# Altium footprint library Modules.PcbLib: 6 footprints (part 5 of 6) (continued)
## ARDUINO MEGA M_Shield [mm] "ARDUINO MEGA 2560 Full Mother Shield" (continued)
3D body: height 8, standoff 7.5, extent -49.251,21.852 -47.219,22.352
3D body: height 8, standoff 7.5, extent -49.268,21.844 -48.768,23.876
3D body: height 8, standoff 7.5, extent -49.276,23.368 -47.244,23.869
3D body: height 8, standoff 7.5, extent -47.752,21.844 -47.252,23.876
3D body: height 7.5, standoff 0, extent -47.752,22.327 -47.727,23.394
3D body: height 7.5, standoff 0, extent -48.793,22.327 -48.768,23.394
3D body: height 7.5, standoff 0, extent -48.793,23.368 -47.727,23.394
3D body: height 7.5, standoff 0, extent -48.793,19.787 -47.727,19.812
3D body: height 8, standoff 0, extent -47.269,19.05 -46.99,21.59
3D body: height 8, standoff 0, extent -49.53,21.311 -46.99,21.59
3D body: height 0, standoff -2.03, extent -48.387,20.066 -48.133,20.574
3D body: height 8, standoff 0, extent -49.53,19.05 -46.99,19.33
3D body: height 7, standoff 0, extent -48.794,19.787 -47.727,19.838
3D body: height 7, standoff 0, extent -47.778,19.787 -47.727,20.854
3D body: height 7, standoff 0, extent -48.794,20.803 -47.727,20.854
3D body: height 7, standoff 0, extent -48.794,19.787 -48.743,20.854
3D body: height 1, standoff 0, extent -48.895,19.685 -47.625,20.955
3D body: height 8, standoff 0, extent -49.53,19.05 -49.251,21.59
3D body: height 8, standoff 7.5, extent -49.251,19.312 -47.219,19.812
3D body: height 8, standoff 7.5, extent -49.268,19.304 -48.768,21.336
3D body: height 8, standoff 7.5, extent -49.276,20.828 -47.244,21.329
3D body: height 8, standoff 7.5, extent -47.752,19.304 -47.252,21.336
3D body: height 7.5, standoff 0, extent -47.752,19.787 -47.727,20.854
3D body: height 7.5, standoff 0, extent -48.793,19.787 -48.768,20.854
3D body: height 7.5, standoff 0, extent -48.793,20.828 -47.727,20.854
3D body: height 7.5, standoff 0, extent -48.793,17.247 -47.727,17.272
3D body: height 8, standoff 0, extent -47.269,16.51 -46.99,19.05
3D body: height 8, standoff 0, extent -49.53,18.771 -46.99,19.05
3D body: height 0, standoff -2.03, extent -48.387,17.526 -48.133,18.034
3D body: height 8, standoff 0, extent -49.53,16.51 -46.99,16.79
3D body: height 7, standoff 0, extent -48.794,17.247 -47.727,17.298
3D body: height 7, standoff 0, extent -47.778,17.247 -47.727,18.314
3D body: height 7, standoff 0, extent -48.794,18.263 -47.727,18.314
3D body: height 7, standoff 0, extent -48.794,17.247 -48.743,18.314
3D body: height 1, standoff 0, extent -48.895,17.145 -47.625,18.415
3D body: height 8, standoff 0, extent -49.53,16.51 -49.251,19.05
3D body: height 8, standoff 7.5, extent -49.251,16.772 -47.219,17.272
3D body: height 8, standoff 7.5, extent -49.268,16.764 -48.768,18.796
3D body: height 8, standoff 7.5, extent -49.276,18.288 -47.244,18.789
3D body: height 8, standoff 7.5, extent -47.752,16.764 -47.252,18.796
3D body: height 7.5, standoff 0, extent -47.752,17.247 -47.727,18.314
3D body: height 7.5, standoff 0, extent -48.793,17.247 -48.768,18.314
3D body: height 7.5, standoff 0, extent -48.793,18.288 -47.727,18.314
3D body: height 7.5, standoff 0, extent -48.793,12.167 -47.727,12.192
3D body: height 8, standoff 0, extent -47.269,11.43 -46.99,13.97
3D body: height 8, standoff 0, extent -49.53,13.691 -46.99,13.97
3D body: height 0, standoff -2.03, extent -48.387,12.446 -48.133,12.954
3D body: height 8, standoff 0, extent -49.53,11.43 -46.99,11.71
3D body: height 7, standoff 0, extent -48.794,12.167 -47.727,12.218
3D body: height 7, standoff 0, extent -47.778,12.167 -47.727,13.234
3D body: height 7, standoff 0, extent -48.794,13.183 -47.727,13.234
3D body: height 7, standoff 0, extent -48.794,12.167 -48.743,13.234
3D body: height 1, standoff 0, extent -48.895,12.065 -47.625,13.335
3D body: height 8, standoff 0, extent -49.53,11.43 -49.251,13.97
3D body: height 8, standoff 7.5, extent -49.251,11.692 -47.219,12.192
3D body: height 8, standoff 7.5, extent -49.268,11.684 -48.768,13.716
3D body: height 8, standoff 7.5, extent -49.276,13.208 -47.244,13.709
3D body: height 8, standoff 7.5, extent -47.752,11.684 -47.252,13.716
3D body: height 7.5, standoff 0, extent -47.752,12.167 -47.727,13.234
3D body: height 7.5, standoff 0, extent -48.793,12.167 -48.768,13.234
3D body: height 7.5, standoff 0, extent -48.793,13.208 -47.727,13.234
3D body: height 7.5, standoff 0, extent -48.793,9.627 -47.727,9.652
3D body: height 8, standoff 0, extent -47.269,8.89 -46.99,11.43
3D body: height 8, standoff 0, extent -49.53,11.151 -46.99,11.43
3D body: height 0, standoff -2.03, extent -48.387,9.906 -48.133,10.414
3D body: height 8, standoff 0, extent -49.53,8.89 -46.99,9.17
3D body: height 7, standoff 0, extent -48.794,9.627 -47.727,9.678
3D body: height 7, standoff 0, extent -47.778,9.627 -47.727,10.694
3D body: height 7, standoff 0, extent -48.794,10.643 -47.727,10.694
3D body: height 7, standoff 0, extent -48.794,9.627 -48.743,10.694
3D body: height 1, standoff 0, extent -48.895,9.525 -47.625,10.795
3D body: height 8, standoff 0, extent -49.53,8.89 -49.251,11.43
3D body: height 8, standoff 7.5, extent -49.251,9.152 -47.219,9.652
3D body: height 8, standoff 7.5, extent -49.268,9.144 -48.768,11.176
3D body: height 8, standoff 7.5, extent -49.276,10.668 -47.244,11.169
3D body: height 8, standoff 7.5, extent -47.752,9.144 -47.252,11.176
3D body: height 7.5, standoff 0, extent -47.752,9.627 -47.727,10.694
3D body: height 7.5, standoff 0, extent -48.793,9.627 -48.768,10.694
3D body: height 7.5, standoff 0, extent -48.793,10.668 -47.727,10.694
3D body: height 7.5, standoff 0, extent -48.793,7.087 -47.727,7.112
3D body: height 8, standoff 0, extent -47.269,6.35 -46.99,8.89
3D body: height 8, standoff 0, extent -49.53,8.611 -46.99,8.89
3D body: height 0, standoff -2.03, extent -48.387,7.366 -48.133,7.874
3D body: height 8, standoff 0, extent -49.53,6.35 -46.99,6.63
3D body: height 7, standoff 0, extent -48.794,7.087 -47.727,7.138
3D body: height 7, standoff 0, extent -47.778,7.087 -47.727,8.154
3D body: height 7, standoff 0, extent -48.794,8.103 -47.727,8.154
3D body: height 7, standoff 0, extent -48.794,7.087 -48.743,8.154
3D body: height 1, standoff 0, extent -48.895,6.985 -47.625,8.255
3D body: height 8, standoff 0, extent -49.53,6.35 -49.251,8.89
3D body: height 8, standoff 7.5, extent -49.251,6.612 -47.219,7.112
3D body: height 8, standoff 7.5, extent -49.268,6.604 -48.768,8.636
3D body: height 8, standoff 7.5, extent -49.276,8.128 -47.244,8.629
3D body: height 8, standoff 7.5, extent -47.752,6.604 -47.252,8.636
3D body: height 7.5, standoff 0, extent -47.752,7.087 -47.727,8.154
3D body: height 7.5, standoff 0, extent -48.793,7.087 -48.768,8.154
3D body: height 7.5, standoff 0, extent -48.793,8.128 -47.727,8.154
3D body: height 7.5, standoff 0, extent -48.793,4.547 -47.727,4.572
3D body: height 8, standoff 0, extent -47.269,3.81 -46.99,6.35
3D body: height 8, standoff 0, extent -49.53,6.071 -46.99,6.35
3D body: height 0, standoff -2.03, extent -48.387,4.826 -48.133,5.334
3D body: height 8, standoff 0, extent -49.53,3.81 -46.99,4.09
3D body: height 7, standoff 0, extent -48.794,4.547 -47.727,4.598
3D body: height 7, standoff 0, extent -47.778,4.547 -47.727,5.614
3D body: height 7, standoff 0, extent -48.794,5.563 -47.727,5.614
3D body: height 7, standoff 0, extent -48.794,4.547 -48.743,5.614
3D body: height 1, standoff 0, extent -48.895,4.445 -47.625,5.715
3D body: height 8, standoff 0, extent -49.53,3.81 -49.251,6.35
3D body: height 8, standoff 7.5, extent -49.251,4.072 -47.219,4.572
3D body: height 8, standoff 7.5, extent -49.268,4.064 -48.768,6.096
3D body: height 8, standoff 7.5, extent -49.276,5.588 -47.244,6.089
3D body: height 8, standoff 7.5, extent -47.752,4.064 -47.252,6.096
3D body: height 7.5, standoff 0, extent -47.752,4.547 -47.727,5.614
3D body: height 7.5, standoff 0, extent -48.793,4.547 -48.768,5.614
3D body: height 7.5, standoff 0, extent -48.793,5.588 -47.727,5.614
3D body: height 7.5, standoff 0, extent -48.793,2.007 -47.727,2.032
3D body: height 8, standoff 0, extent -47.269,1.27 -46.99,3.81
3D body: height 8, standoff 0, extent -49.53,3.531 -46.99,3.81
3D body: height 0, standoff -2.03, extent -48.387,2.286 -48.133,2.794
3D body: height 8, standoff 0, extent -49.53,1.27 -46.99,1.55
3D body: height 7, standoff 0, extent -48.794,2.007 -47.727,2.058
3D body: height 7, standoff 0, extent -47.778,2.007 -47.727,3.074
3D body: height 7, standoff 0, extent -48.794,3.023 -47.727,3.074
3D body: height 7, standoff 0, extent -48.794,2.007 -48.743,3.074
3D body: height 1, standoff 0, extent -48.895,1.905 -47.625,3.175
3D body: height 8, standoff 0, extent -49.53,1.27 -49.251,3.81
3D body: height 8, standoff 7.5, extent -49.251,1.532 -47.219,2.032
3D body: height 8, standoff 7.5, extent -49.268,1.524 -48.768,3.556
3D body: height 8, standoff 7.5, extent -49.276,3.048 -47.244,3.549
3D body: height 8, standoff 7.5, extent -47.752,1.524 -47.252,3.556
3D body: height 7.5, standoff 0, extent -47.752,2.007 -47.727,3.074
3D body: height 7.5, standoff 0, extent -48.793,2.007 -48.768,3.074
3D body: height 7.5, standoff 0, extent -48.793,3.048 -47.727,3.074
3D body: height 7.5, standoff 0, extent -48.793,-0.533 -47.727,-0.508
3D body: height 8, standoff 0, extent -47.269,-1.27 -46.99,1.27
3D body: height 8, standoff 0, extent -49.53,0.991 -46.99,1.27
3D body: height 0, standoff -2.03, extent -48.387,-0.254 -48.133,0.254
3D body: height 8, standoff 0, extent -49.53,-1.27 -46.99,-0.99
3D body: height 7, standoff 0, extent -48.794,-0.533 -47.727,-0.482
3D body: height 7, standoff 0, extent -47.778,-0.533 -47.727,0.534
3D body: height 7, standoff 0, extent -48.794,0.483 -47.727,0.534
3D body: height 7, standoff 0, extent -48.794,-0.533 -48.743,0.534
3D body: height 1, standoff 0, extent -48.895,-0.635 -47.625,0.635
3D body: height 8, standoff 0, extent -49.53,-1.27 -49.251,1.27
3D body: height 8, standoff 7.5, extent -49.251,-1.008 -47.219,-0.508
3D body: height 8, standoff 7.5, extent -49.268,-1.016 -48.768,1.016
3D body: height 8, standoff 7.5, extent -49.276,0.508 -47.244,1.009
3D body: height 8, standoff 7.5, extent -47.752,-1.016 -47.252,1.016
3D body: height 7.5, standoff 0, extent -47.752,-0.533 -47.727,0.534
3D body: height 7.5, standoff 0, extent -48.793,-0.533 -48.768,0.534
3D body: height 7.5, standoff 0, extent -48.793,0.508 -47.727,0.534
3D body: height 7.5, standoff 0, extent -48.793,-3.073 -47.727,-3.048
3D body: height 8, standoff 0, extent -47.269,-3.81 -46.99,-1.27
3D body: height 8, standoff 0, extent -49.53,-1.549 -46.99,-1.27
3D body: height 0, standoff -2.03, extent -48.387,-2.794 -48.133,-2.286
3D body: height 8, standoff 0, extent -49.53,-3.81 -46.99,-3.53
3D body: height 7, standoff 0, extent -48.794,-3.073 -47.727,-3.022
3D body: height 7, standoff 0, extent -47.778,-3.073 -47.727,-2.006
3D body: height 7, standoff 0, extent -48.794,-2.057 -47.727,-2.006
3D body: height 7, standoff 0, extent -48.794,-3.073 -48.743,-2.006
3D body: height 1, standoff 0, extent -48.895,-3.175 -47.625,-1.905
3D body: height 8, standoff 0, extent -49.53,-3.81 -49.251,-1.27
3D body: height 8, standoff 7.5, extent -49.251,-3.548 -47.219,-3.048
3D body: height 8, standoff 7.5, extent -49.268,-3.556 -48.768,-1.524
3D body: height 8, standoff 7.5, extent -49.276,-2.032 -47.244,-1.531
3D body: height 8, standoff 7.5, extent -47.752,-3.556 -47.252,-1.524
3D body: height 7.5, standoff 0, extent -47.752,-3.073 -47.727,-2.006
3D body: height 7.5, standoff 0, extent -48.793,-3.073 -48.768,-2.006
3D body: height 7.5, standoff 0, extent -48.793,-2.032 -47.727,-2.006
3D body: height 7.5, standoff 0, extent -48.793,-5.613 -47.727,-5.588
3D body: height 8, standoff 0, extent -47.269,-6.35 -46.99,-3.81
3D body: height 8, standoff 0, extent -49.53,-4.089 -46.99,-3.81
3D body: height 0, standoff -2.03, extent -48.387,-5.334 -48.133,-4.826
3D body: height 8, standoff 0, extent -49.53,-6.35 -46.99,-6.07
3D body: height 7, standoff 0, extent -48.794,-5.613 -47.727,-5.562
3D body: height 7, standoff 0, extent -47.778,-5.613 -47.727,-4.546
3D body: height 7, standoff 0, extent -48.794,-4.597 -47.727,-4.546
3D body: height 7, standoff 0, extent -48.794,-5.613 -48.743,-4.546
3D body: height 1, standoff 0, extent -48.895,-5.715 -47.625,-4.445
3D body: height 8, standoff 0, extent -49.53,-6.35 -49.251,-3.81
3D body: height 8, standoff 7.5, extent -49.251,-6.088 -47.219,-5.588
3D body: height 8, standoff 7.5, extent -49.268,-6.096 -48.768,-4.064
3D body: height 8, standoff 7.5, extent -49.276,-4.572 -47.244,-4.071
3D body: height 8, standoff 7.5, extent -47.752,-6.096 -47.252,-4.064
3D body: height 7.5, standoff 0, extent -47.752,-5.613 -47.727,-4.546
3D body: height 7.5, standoff 0, extent -48.793,-5.613 -48.768,-4.546
3D body: height 7.5, standoff 0, extent -48.793,-4.572 -47.727,-4.546
3D body: height 7.5, standoff 0, extent -0.533,25.908 0.533,25.934
3D body: height 7.5, standoff 0, extent -0.533,24.867 -0.508,25.934
3D body: height 7.5, standoff 0, extent 0.508,24.867 0.533,25.934
3D body: height 8, standoff 7.5, extent 0.508,24.384 1.008,26.416
3D body: height 8, standoff 7.5, extent -1.016,25.908 1.016,26.409
3D body: height 8, standoff 7.5, extent -1.008,24.384 -0.508,26.416
3D body: height 8, standoff 7.5, extent -0.991,24.392 1.041,24.892
3D body: height 8, standoff 0, extent -1.27,24.13 -0.991,26.67
3D body: height 1, standoff 0, extent -0.635,24.765 0.635,26.035
3D body: height 7, standoff 0, extent -0.534,24.867 -0.483,25.934
3D body: height 7, standoff 0, extent -0.534,25.883 0.533,25.934
3D body: height 7, standoff 0, extent 0.482,24.867 0.533,25.934
3D body: height 7, standoff 0, extent -0.534,24.867 0.533,24.918
3D body: height 8, standoff 0, extent -1.27,24.13 1.27,24.41
3D body: height 0, standoff -2.03, extent -0.127,25.146 0.127,25.654
3D body: height 8, standoff 0, extent -1.27,26.391 1.27,26.67
3D body: height 8, standoff 0, extent 0.991,24.13 1.27,26.67
3D body: height 7.5, standoff 0, extent -0.533,24.867 0.533,24.892
3D body: height 7.5, standoff 0, extent -0.533,23.368 0.533,23.394
3D body: height 7.5, standoff 0, extent -0.533,22.327 -0.508,23.394
3D body: height 7.5, standoff 0, extent 0.508,22.327 0.533,23.394
3D body: height 8, standoff 7.5, extent 0.508,21.844 1.008,23.876
3D body: height 8, standoff 7.5, extent -1.016,23.368 1.016,23.869
3D body: height 8, standoff 7.5, extent -1.008,21.844 -0.508,23.876
3D body: height 8, standoff 7.5, extent -0.991,21.852 1.041,22.352
3D body: height 8, standoff 0, extent -1.27,21.59 -0.991,24.13
3D body: height 1, standoff 0, extent -0.635,22.225 0.635,23.495
3D body: height 7, standoff 0, extent -0.534,22.327 -0.483,23.394
3D body: height 7, standoff 0, extent -0.534,23.343 0.533,23.394
3D body: height 7, standoff 0, extent 0.482,22.327 0.533,23.394
3D body: height 7, standoff 0, extent -0.534,22.327 0.533,22.378
3D body: height 8, standoff 0, extent -1.27,21.59 1.27,21.87
3D body: height 0, standoff -2.03, extent -0.127,22.606 0.127,23.114
3D body: height 8, standoff 0, extent -1.27,23.851 1.27,24.13
3D body: height 8, standoff 0, extent 0.991,21.59 1.27,24.13
3D body: height 7.5, standoff 0, extent -0.533,22.327 0.533,22.352
3D body: height 7.5, standoff 0, extent -0.533,30.988 0.533,31.014
3D body: height 7.5, standoff 0, extent -0.533,29.947 -0.508,31.014
3D body: height 7.5, standoff 0, extent 0.508,29.947 0.533,31.014
3D body: height 8, standoff 7.5, extent 0.508,29.464 1.008,31.496
3D body: height 8, standoff 7.5, extent -1.016,30.988 1.016,31.489
3D body: height 8, standoff 7.5, extent -1.008,29.464 -0.508,31.496
3D body: height 8, standoff 7.5, extent -0.991,29.472 1.041,29.972
3D body: height 8, standoff 0, extent -1.27,29.21 -0.991,31.75
3D body: height 1, standoff 0, extent -0.635,29.845 0.635,31.115
3D body: height 7, standoff 0, extent -0.534,29.947 -0.483,31.014
3D body: height 7, standoff 0, extent -0.534,30.963 0.533,31.014
3D body: height 7, standoff 0, extent 0.482,29.947 0.533,31.014
3D body: height 7, standoff 0, extent -0.534,29.947 0.533,29.998
3D body: height 8, standoff 0, extent -1.27,29.21 1.27,29.49
3D body: height 0, standoff -2.03, extent -0.127,30.226 0.127,30.734
3D body: height 8, standoff 0, extent -1.27,31.471 1.27,31.75
3D body: height 8, standoff 0, extent 0.991,29.21 1.27,31.75
3D body: height 7.5, standoff 0, extent -0.533,29.947 0.533,29.972
3D body: height 7.5, standoff 0, extent -0.533,28.448 0.533,28.474
3D body: height 7.5, standoff 0, extent -0.533,27.407 -0.508,28.474
3D body: height 7.5, standoff 0, extent 0.508,27.407 0.533,28.474
3D body: height 8, standoff 7.5, extent 0.508,26.924 1.008,28.956
3D body: height 8, standoff 7.5, extent -1.016,28.448 1.016,28.949
3D body: height 8, standoff 7.5, extent -1.008,26.924 -0.508,28.956
3D body: height 8, standoff 7.5, extent -0.991,26.932 1.041,27.432
3D body: height 8, standoff 0, extent -1.27,26.67 -0.991,29.21
3D body: height 1, standoff 0, extent -0.635,27.305 0.635,28.575
3D body: height 7, standoff 0, extent -0.534,27.407 -0.483,28.474
3D body: height 7, standoff 0, extent -0.534,28.423 0.533,28.474
3D body: height 7, standoff 0, extent 0.482,27.407 0.533,28.474
3D body: height 7, standoff 0, extent -0.534,27.407 0.533,27.458
3D body: height 8, standoff 0, extent -1.27,26.67 1.27,26.95
3D body: height 0, standoff -2.03, extent -0.127,27.686 0.127,28.194
3D body: height 8, standoff 0, extent -1.27,28.931 1.27,29.21
3D body: height 8, standoff 0, extent 0.991,26.67 1.27,29.21
3D body: height 7.5, standoff 0, extent -0.533,27.407 0.533,27.432
3D body: height 7.5, standoff 0, extent -0.533,36.068 0.533,36.094
3D body: height 7.5, standoff 0, extent -0.533,35.027 -0.508,36.094
3D body: height 7.5, standoff 0, extent 0.508,35.027 0.533,36.094
3D body: height 8, standoff 7.5, extent 0.508,34.544 1.008,36.576
3D body: height 8, standoff 7.5, extent -1.016,36.068 1.016,36.569
3D body: height 8, standoff 7.5, extent -1.008,34.544 -0.508,36.576
3D body: height 8, standoff 7.5, extent -0.991,34.552 1.041,35.052
3D body: height 8, standoff 0, extent -1.27,34.29 -0.991,36.83
3D body: height 1, standoff 0, extent -0.635,34.925 0.635,36.195
3D body: height 7, standoff 0, extent -0.534,35.027 -0.483,36.094
3D body: height 7, standoff 0, extent -0.534,36.043 0.533,36.094
3D body: height 7, standoff 0, extent 0.482,35.027 0.533,36.094
3D body: height 7, standoff 0, extent -0.534,35.027 0.533,35.078
3D body: height 8, standoff 0, extent -1.27,34.29 1.27,34.57
3D body: height 0, standoff -2.03, extent -0.127,35.306 0.127,35.814
3D body: height 8, standoff 0, extent -1.27,36.551 1.27,36.83
3D body: height 8, standoff 0, extent 0.991,34.29 1.27,36.83
3D body: height 7.5, standoff 0, extent -0.533,35.027 0.533,35.052
3D body: height 7.5, standoff 0, extent -0.533,33.528 0.533,33.554
3D body: height 7.5, standoff 0, extent -0.533,32.487 -0.508,33.554
3D body: height 7.5, standoff 0, extent 0.508,32.487 0.533,33.554
3D body: height 8, standoff 7.5, extent 0.508,32.004 1.008,34.036
3D body: height 8, standoff 7.5, extent -1.016,33.528 1.016,34.029
3D body: height 8, standoff 7.5, extent -1.008,32.004 -0.508,34.036
3D body: height 8, standoff 7.5, extent -0.991,32.012 1.041,32.512
3D body: height 8, standoff 0, extent -1.27,31.75 -0.991,34.29
3D body: height 1, standoff 0, extent -0.635,32.385 0.635,33.655
3D body: height 7, standoff 0, extent -0.534,32.487 -0.483,33.554
3D body: height 7, standoff 0, extent -0.534,33.503 0.533,33.554
3D body: height 7, standoff 0, extent 0.482,32.487 0.533,33.554
3D body: height 7, standoff 0, extent -0.534,32.487 0.533,32.538
3D body: height 8, standoff 0, extent -1.27,31.75 1.27,32.03
3D body: height 0, standoff -2.03, extent -0.127,32.766 0.127,33.274
3D body: height 8, standoff 0, extent -1.27,34.011 1.27,34.29
3D body: height 8, standoff 0, extent 0.991,31.75 1.27,34.29
3D body: height 7.5, standoff 0, extent -0.533,32.487 0.533,32.512
3D body: height 7.5, standoff 0, extent -0.533,41.148 0.533,41.174
3D body: height 7.5, standoff 0, extent -0.533,40.107 -0.508,41.174
3D body: height 7.5, standoff 0, extent 0.508,40.107 0.533,41.174
3D body: height 8, standoff 7.5, extent 0.508,39.624 1.008,41.656
3D body: height 8, standoff 7.5, extent -1.016,41.148 1.016,41.649
3D body: height 8, standoff 7.5, extent -1.008,39.624 -0.508,41.656
3D body: height 8, standoff 7.5, extent -0.991,39.632 1.041,40.132
3D body: height 8, standoff 0, extent -1.27,39.37 -0.991,41.91
3D body: height 1, standoff 0, extent -0.635,40.005 0.635,41.275
3D body: height 7, standoff 0, extent -0.534,40.107 -0.483,41.174
3D body: height 7, standoff 0, extent -0.534,41.123 0.533,41.174
3D body: height 7, standoff 0, extent 0.482,40.107 0.533,41.174
3D body: height 7, standoff 0, extent -0.534,40.107 0.533,40.158
3D body: height 8, standoff 0, extent -1.27,39.37 1.27,39.65
3D body: height 0, standoff -2.03, extent -0.127,40.386 0.127,40.894
3D body: height 8, standoff 0, extent -1.27,41.631 1.27,41.91
3D body: height 8, standoff 0, extent 0.991,39.37 1.27,41.91
3D body: height 7.5, standoff 0, extent -0.533,40.107 0.533,40.132
3D body: height 7.5, standoff 0, extent -0.533,38.608 0.533,38.634
3D body: height 7.5, standoff 0, extent -0.533,37.567 -0.508,38.634
3D body: height 7.5, standoff 0, extent 0.508,37.567 0.533,38.634
3D body: height 8, standoff 7.5, extent 0.508,37.084 1.008,39.116
3D body: height 8, standoff 7.5, extent -1.016,38.608 1.016,39.109
3D body: height 8, standoff 7.5, extent -1.008,37.084 -0.508,39.116
3D body: height 8, standoff 7.5, extent -0.991,37.092 1.041,37.592
3D body: height 8, standoff 0, extent -1.27,36.83 -0.991,39.37
3D body: height 1, standoff 0, extent -0.635,37.465 0.635,38.735
3D body: height 7, standoff 0, extent -0.534,37.567 -0.483,38.634
3D body: height 7, standoff 0, extent -0.534,38.583 0.533,38.634
3D body: height 7, standoff 0, extent 0.482,37.567 0.533,38.634
3D body: height 7, standoff 0, extent -0.534,37.567 0.533,37.618
3D body: height 8, standoff 0, extent -1.27,36.83 1.27,37.11
3D body: height 0, standoff -2.03, extent -0.127,37.846 0.127,38.354
3D body: height 8, standoff 0, extent -1.27,39.091 1.27,39.37
3D body: height 8, standoff 0, extent 0.991,36.83 1.27,39.37
3D body: height 7.5, standoff 0, extent -0.533,37.567 0.533,37.592
3D body: height 7.5, standoff 0, extent -0.533,14.707 0.533,14.732
3D body: height 8, standoff 0, extent 0.991,13.97 1.27,16.51
3D body: height 8, standoff 0, extent -1.27,16.231 1.27,16.51
3D body: height 0, standoff -2.03, extent -0.127,14.986 0.127,15.494
3D body: height 8, standoff 0, extent -1.27,13.97 1.27,14.25
3D body: height 7, standoff 0, extent -0.534,14.707 0.533,14.758
3D body: height 7, standoff 0, extent 0.482,14.707 0.533,15.774
3D body: height 7, standoff 0, extent -0.534,15.723 0.533,15.774
3D body: height 7, standoff 0, extent -0.534,14.707 -0.483,15.774
3D body: height 1, standoff 0, extent -0.635,14.605 0.635,15.875
3D body: height 8, standoff 0, extent -1.27,13.97 -0.991,16.51
3D body: height 8, standoff 7.5, extent -0.991,14.232 1.041,14.732
3D body: height 8, standoff 7.5, extent -1.008,14.224 -0.508,16.256
3D body: height 8, standoff 7.5, extent -1.016,15.748 1.016,16.249
3D body: height 8, standoff 7.5, extent 0.508,14.224 1.008,16.256
3D body: height 7.5, standoff 0, extent 0.508,14.707 0.533,15.774
3D body: height 7.5, standoff 0, extent -0.533,14.707 -0.508,15.774
3D body: height 7.5, standoff 0, extent -0.533,15.748 0.533,15.774
3D body: height 7.5, standoff 0, extent -0.533,17.247 0.533,17.272
3D body: height 8, standoff 0, extent 0.991,16.51 1.27,19.05
3D body: height 8, standoff 0, extent -1.27,18.771 1.27,19.05
3D body: height 0, standoff -2.03, extent -0.127,17.526 0.127,18.034
3D body: height 8, standoff 0, extent -1.27,16.51 1.27,16.79
3D body: height 7, standoff 0, extent -0.534,17.247 0.533,17.298
3D body: height 7, standoff 0, extent 0.482,17.247 0.533,18.314
3D body: height 7, standoff 0, extent -0.534,18.263 0.533,18.314
3D body: height 7, standoff 0, extent -0.534,17.247 -0.483,18.314
3D body: height 1, standoff 0, extent -0.635,17.145 0.635,18.415
3D body: height 8, standoff 0, extent -1.27,16.51 -0.991,19.05
3D body: height 8, standoff 7.5, extent -0.991,16.772 1.041,17.272
3D body: height 8, standoff 7.5, extent -1.008,16.764 -0.508,18.796
3D body: height 8, standoff 7.5, extent -1.016,18.288 1.016,18.789
3D body: height 8, standoff 7.5, extent 0.508,16.764 1.008,18.796
3D body: height 7.5, standoff 0, extent 0.508,17.247 0.533,18.314
3D body: height 7.5, standoff 0, extent -0.533,17.247 -0.508,18.314
3D body: height 7.5, standoff 0, extent -0.533,18.288 0.533,18.314
3D body: height 7.5, standoff 0, extent -0.533,9.627 0.533,9.652
3D body: height 8, standoff 0, extent 0.991,8.89 1.27,11.43
3D body: height 8, standoff 0, extent -1.27,11.151 1.27,11.43
3D body: height 0, standoff -2.03, extent -0.127,9.906 0.127,10.414
3D body: height 8, standoff 0, extent -1.27,8.89 1.27,9.17
3D body: height 7, standoff 0, extent -0.534,9.627 0.533,9.678
3D body: height 7, standoff 0, extent 0.482,9.627 0.533,10.694
3D body: height 7, standoff 0, extent -0.534,10.643 0.533,10.694
3D body: height 7, standoff 0, extent -0.534,9.627 -0.483,10.694
3D body: height 1, standoff 0, extent -0.635,9.525 0.635,10.795
3D body: height 8, standoff 0, extent -1.27,8.89 -0.991,11.43
3D body: height 8, standoff 7.5, extent -0.991,9.152 1.041,9.652
3D body: height 8, standoff 7.5, extent -1.008,9.144 -0.508,11.176
3D body: height 8, standoff 7.5, extent -1.016,10.668 1.016,11.169
3D body: height 8, standoff 7.5, extent 0.508,9.144 1.008,11.176
3D body: height 7.5, standoff 0, extent 0.508,9.627 0.533,10.694
3D body: height 7.5, standoff 0, extent -0.533,9.627 -0.508,10.694
3D body: height 7.5, standoff 0, extent -0.533,10.668 0.533,10.694
3D body: height 7.5, standoff 0, extent -0.533,12.167 0.533,12.192
3D body: height 8, standoff 0, extent 0.991,11.43 1.27,13.97
3D body: height 8, standoff 0, extent -1.27,13.691 1.27,13.97
3D body: height 0, standoff -2.03, extent -0.127,12.446 0.127,12.954
3D body: height 8, standoff 0, extent -1.27,11.43 1.27,11.71
3D body: height 7, standoff 0, extent -0.534,12.167 0.533,12.218
3D body: height 7, standoff 0, extent 0.482,12.167 0.533,13.234
3D body: height 7, standoff 0, extent -0.534,13.183 0.533,13.234
3D body: height 7, standoff 0, extent -0.534,12.167 -0.483,13.234
3D body: height 1, standoff 0, extent -0.635,12.065 0.635,13.335
3D body: height 8, standoff 0, extent -1.27,11.43 -0.991,13.97
3D body: height 8, standoff 7.5, extent -0.991,11.692 1.041,12.192
3D body: height 8, standoff 7.5, extent -1.008,11.684 -0.508,13.716
3D body: height 8, standoff 7.5, extent -1.016,13.208 1.016,13.709
3D body: height 8, standoff 7.5, extent 0.508,11.684 1.008,13.716
3D body: height 7.5, standoff 0, extent 0.508,12.167 0.533,13.234
3D body: height 7.5, standoff 0, extent -0.533,12.167 -0.508,13.234
3D body: height 7.5, standoff 0, extent -0.533,13.208 0.533,13.234
3D body: height 7.5, standoff 0, extent -0.533,4.547 0.533,4.572
3D body: height 8, standoff 0, extent 0.991,3.81 1.27,6.35
3D body: height 8, standoff 0, extent -1.27,6.071 1.27,6.35
3D body: height 0, standoff -2.03, extent -0.127,4.826 0.127,5.334
3D body: height 8, standoff 0, extent -1.27,3.81 1.27,4.09
3D body: height 7, standoff 0, extent -0.534,4.547 0.533,4.598
3D body: height 7, standoff 0, extent 0.482,4.547 0.533,5.614
3D body: height 7, standoff 0, extent -0.534,5.563 0.533,5.614
3D body: height 7, standoff 0, extent -0.534,4.547 -0.483,5.614
3D body: height 1, standoff 0, extent -0.635,4.445 0.635,5.715
3D body: height 8, standoff 0, extent -1.27,3.81 -0.991,6.35
3D body: height 8, standoff 7.5, extent -0.991,4.072 1.041,4.572
3D body: height 8, standoff 7.5, extent -1.008,4.064 -0.508,6.096
3D body: height 8, standoff 7.5, extent -1.016,5.588 1.016,6.089
3D body: height 8, standoff 7.5, extent 0.508,4.064 1.008,6.096
3D body: height 7.5, standoff 0, extent 0.508,4.547 0.533,5.614
3D body: height 7.5, standoff 0, extent -0.533,4.547 -0.508,5.614
3D body: height 7.5, standoff 0, extent -0.533,5.588 0.533,5.614
3D body: height 7.5, standoff 0, extent -0.533,7.087 0.533,7.112
3D body: height 8, standoff 0, extent 0.991,6.35 1.27,8.89
3D body: height 8, standoff 0, extent -1.27,8.611 1.27,8.89
3D body: height 0, standoff -2.03, extent -0.127,7.366 0.127,7.874
3D body: height 8, standoff 0, extent -1.27,6.35 1.27,6.63
3D body: height 7, standoff 0, extent -0.534,7.087 0.533,7.138
3D body: height 7, standoff 0, extent 0.482,7.087 0.533,8.154
3D body: height 7, standoff 0, extent -0.534,8.103 0.533,8.154
3D body: height 7, standoff 0, extent -0.534,7.087 -0.483,8.154
3D body: height 1, standoff 0, extent -0.635,6.985 0.635,8.255
3D body: height 8, standoff 0, extent -1.27,6.35 -0.991,8.89
3D body: height 8, standoff 7.5, extent -0.991,6.612 1.041,7.112
3D body: height 8, standoff 7.5, extent -1.008,6.604 -0.508,8.636
3D body: height 8, standoff 7.5, extent -1.016,8.128 1.016,8.629
3D body: height 8, standoff 7.5, extent 0.508,6.604 1.008,8.636
3D body: height 7.5, standoff 0, extent 0.508,7.087 0.533,8.154
3D body: height 7.5, standoff 0, extent -0.533,7.087 -0.508,8.154
3D body: height 7.5, standoff 0, extent -0.533,8.128 0.533,8.154
3D body: height 7.5, standoff 0, extent -0.533,-0.533 0.533,-0.508
3D body: height 8, standoff 0, extent 0.991,-1.27 1.27,1.27
3D body: height 8, standoff 0, extent -1.27,0.991 1.27,1.27
3D body: height 0, standoff -2.03, extent -0.127,-0.254 0.127,0.254
3D body: height 8, standoff 0, extent -1.27,-1.27 1.27,-0.99
3D body: height 7, standoff 0, extent -0.534,-0.533 0.533,-0.482
3D body: height 7, standoff 0, extent 0.482,-0.533 0.533,0.534
3D body: height 7, standoff 0, extent -0.534,0.483 0.533,0.534
3D body: height 7, standoff 0, extent -0.534,-0.533 -0.483,0.534
3D body: height 1, standoff 0, extent -0.635,-0.635 0.635,0.635
3D body: height 8, standoff 0, extent -1.27,-1.27 -0.991,1.27
3D body: height 8, standoff 7.5, extent -0.991,-1.008 1.041,-0.508
3D body: height 8, standoff 7.5, extent -1.008,-1.016 -0.508,1.016
3D body: height 8, standoff 7.5, extent -1.016,0.508 1.016,1.009
3D body: height 8, standoff 7.5, extent 0.508,-1.016 1.008,1.016
3D body: height 7.5, standoff 0, extent 0.508,-0.533 0.533,0.534
3D body: height 7.5, standoff 0, extent -0.533,-0.533 -0.508,0.534
3D body: height 7.5, standoff 0, extent -0.533,0.508 0.533,0.534
3D body: height 7.5, standoff 0, extent -0.533,2.007 0.533,2.032
3D body: height 8, standoff 0, extent 0.991,1.27 1.27,3.81
3D body: height 8, standoff 0, extent -1.27,3.531 1.27,3.81
3D body: height 0, standoff -2.03, extent -0.127,2.286 0.127,2.794
3D body: height 8, standoff 0, extent -1.27,1.27 1.27,1.55
3D body: height 7, standoff 0, extent -0.534,2.007 0.533,2.058
3D body: height 7, standoff 0, extent 0.482,2.007 0.533,3.074
3D body: height 7, standoff 0, extent -0.534,3.023 0.533,3.074
3D body: height 7, standoff 0, extent -0.534,2.007 -0.483,3.074
3D body: height 1, standoff 0, extent -0.635,1.905 0.635,3.175
3D body: height 8, standoff 0, extent -1.27,1.27 -0.991,3.81
3D body: height 8, standoff 7.5, extent -0.991,1.532 1.041,2.032
3D body: height 8, standoff 7.5, extent -1.008,1.524 -0.508,3.556
3D body: height 8, standoff 7.5, extent -1.016,3.048 1.016,3.549
3D body: height 8, standoff 7.5, extent 0.508,1.524 1.008,3.556
3D body: height 7.5, standoff 0, extent 0.508,2.007 0.533,3.074
3D body: height 7.5, standoff 0, extent -0.533,2.007 -0.508,3.074
3D body: height 7.5, standoff 0, extent -0.533,3.048 0.533,3.074